# Altium footprint library 1.05-直插电感、共模电感.PcbLib: 35 footprints (part 1 of 3)
Each footprint in its own frame and in the unit in brackets; x right, y up, seen from the top. Pads: shape width x height; smd on the part's side, far side on the other; paste and mask are expansions set on the pad; w line width, h text height; cw(c..) or ccw(c..) is an arc to the next point about the centre after c.
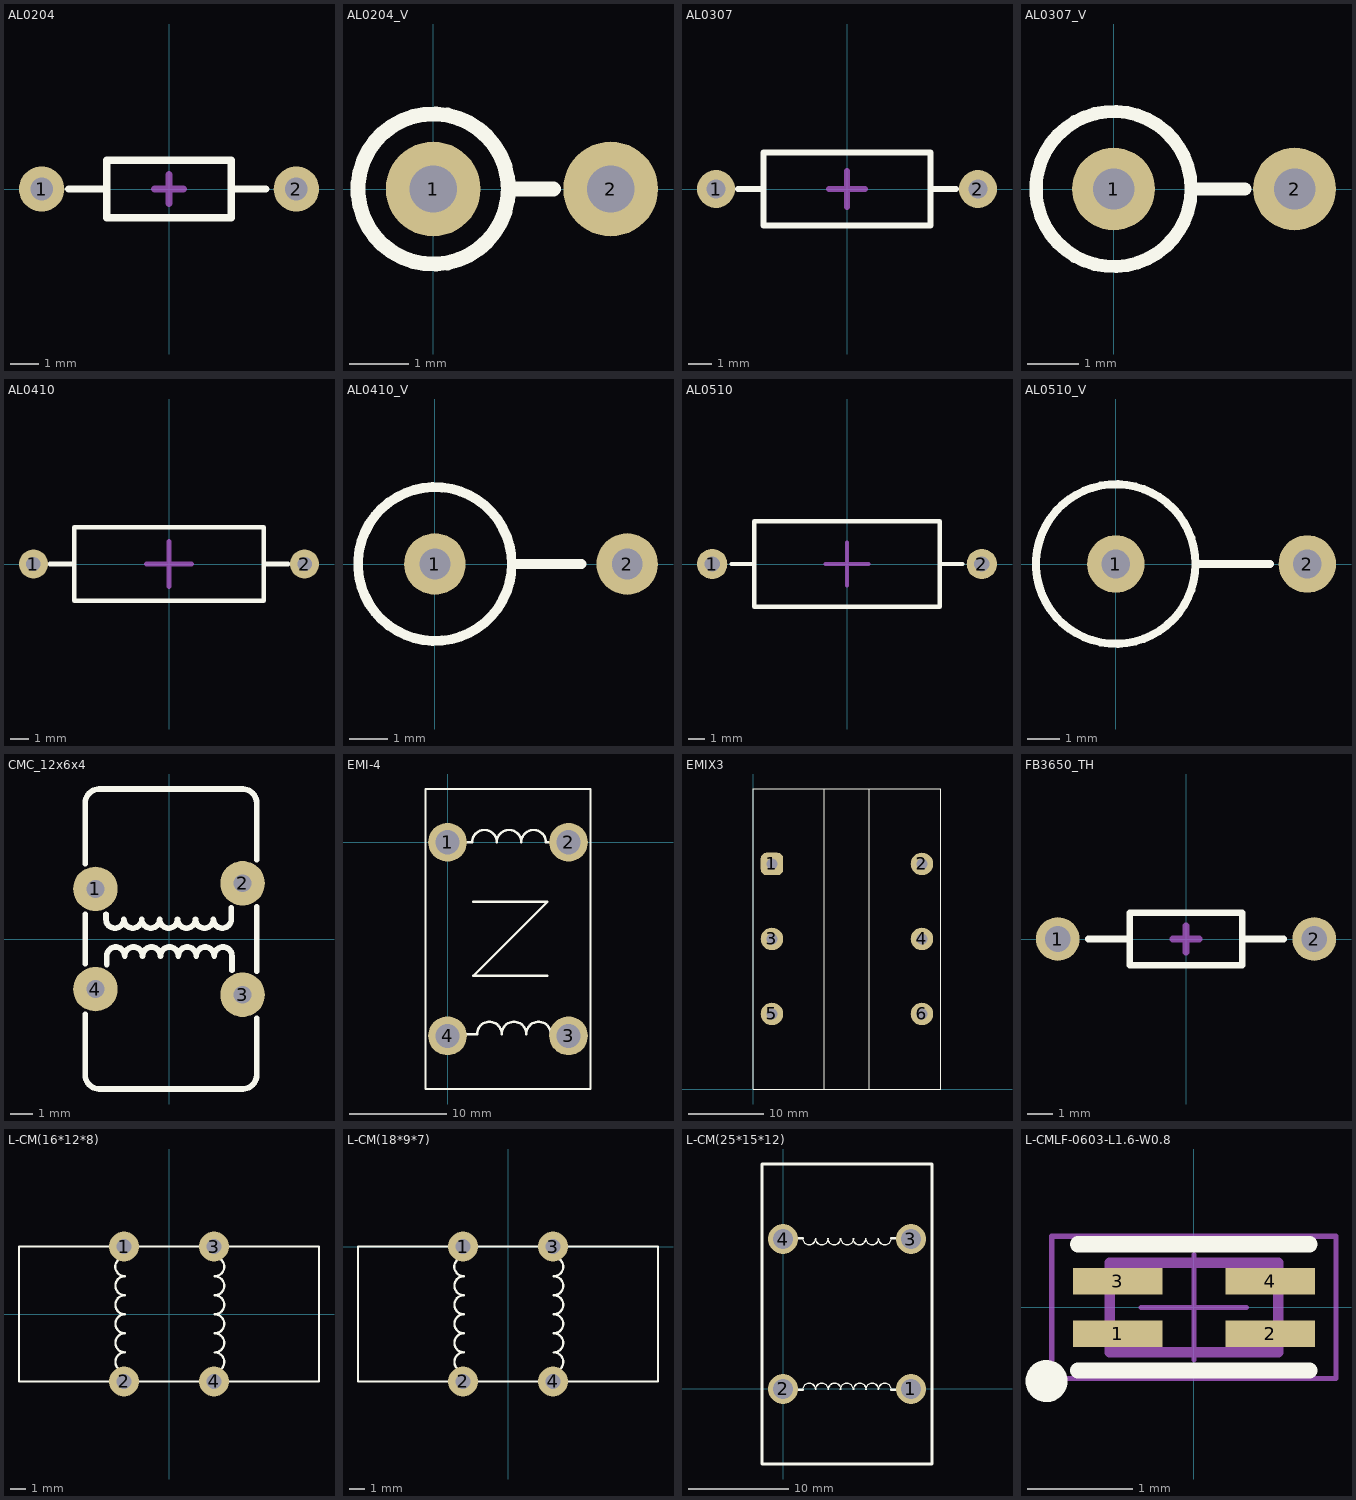
[diagram p0: the footprints below, top view; thin cyan lines are the x and y axes]

## AL0204 [mm] "9*2*4mm（脚距，直径，长度）"
pads (2):
  round 1.6 hole 0.8: 1(-4.5,0) 2(4.5,0)
Top Overlay:
  lines w0.254: -3.556,0 -2.2,0 ; -1.608,1.016 1.397,1.016 ; -1.524,-1.016 1.397,-1.016 ; -1.016,-1.016 -2.2,-1.016 -2.2,1.016 -1.016,1.016 ; -0.508,-1.016 0.508,-1.016 ; -0.508,1.016 0.508,1.016 ; 1.016,-1.016 2.2,-1.016 2.2,1.016 1.016,1.016 ; 2.2,0 3.429,0
Mechanical 15:
  lines w0.254: -0.508,0 0.508,0 ; 0,-0.508 0,0.508
3D body: height 2.07, standoff -3.5, extent -4.75,-1.018 4.75,1.018

## AL0204_V [mm] "3*2*4mm（脚距，直径，长度）"
pads (2):
  round 1.6 hole 0.8: 1(0,0) 2(3,0)
Top Overlay:
  circle w0.254: c0,0 r1.27
  lines w0.254: 1.27,0 2.032,0
3D body: height 5.48, standoff -3.5, extent -1.009,-1.009 3.25,1.009

## AL0307 [mm] "11*3*7mm（脚距，直径，长度）           联系卖家 免费查找封装"
pads (2):
  round 1.6 hole 0.8: 1(-5.5,0) 2(5.5,0)
Top Overlay:
  lines w0.254: -4.572,0 -3.5,0 ; -1.651,1.524 1.524,1.524 3.5,1.524 3.5,-1.524 1.524,-1.524 ; -1.524,1.524 -3.5,1.524 -3.5,-1.524 -1.524,-1.524 1.778,-1.524 ; -0.762,-1.524 0.762,-1.524 ; -0.762,1.524 0.762,1.524 ; 3.5,0 4.572,0
Mechanical 15:
  lines w0.254: -0.762,0 0.762,0 ; 0,-0.762 0,0.762
3D body: height 3.06, standoff -3.5, extent -5.775,-1.51 5.775,1.51

## AL0307_V [mm] "3.5*3*7mm（脚距，直径，长度）           联系卖家 免费查找封装"
pads (2):
  round 1.6 hole 0.8: 1(0,0) 2(3.5,0)
Top Overlay:
  circle w0.254: c0,0 r1.5
  lines w0.254: 1.5,0 2.54,0
3D body: height 8.8, standoff -3.5, extent -1.522,-1.522 3.775,1.522

## AL0410 [mm] "15*4*10.5mm（脚距，直径，长度）            联系卖家 免费查找封装"
pads (2):
  round 1.6 hole 0.8: 1(-7.5,0) 2(7.5,0)
Top Overlay:
  lines w0.254: -6.604,0 -5.25,0 ; -1.27,-2.032 1.27,-2.032 ; -1.27,2.032 1.27,2.032 ; 2.54,2.032 5.25,2.032 5.25,-2.032 2.54,-2.032 -2.54,-2.032 -5.25,-2.032 -5.25,2.032 -2.54,2.032 3.048,2.032 ; 5.25,0 6.604,0
Mechanical 15:
  lines w0.254: -1.27,0 1.27,0 ; 0,-1.27 0,1.27
3D body: height 4.06, standoff -3.5, extent -7.775,-2.009 7.775,2.009

## AL0410_V [mm] "5*4*10.5mm（脚距，直径，长度）           联系卖家 免费查找封装"
pads (2):
  round 1.6 hole 0.8: 1(0,0) 2(5,0)
Top Overlay:
  circle w0.254: c0,0 r2
  lines w0.254: 2,0 3.81,0
3D body: height 12.38, standoff -3.5, extent -2.01,-2.01 5.325,2.01

## AL0510 [mm] "16*5*10.5mm（脚距，直径，长度）           联系卖家 免费查找封装"
pads (2):
  round 1.8 hole 0.9: 1(-8,0) 2(8,0)
Top Overlay:
  lines w0.254: -6.858,0 -5.5,0 ; -2.794,2.54 2.921,2.54 ; -2.54,2.54 -5.5,2.54 -5.5,-2.54 -2.54,-2.54 3.048,-2.54 ; -1.27,-2.54 1.27,-2.54 ; -1.27,2.54 1.27,2.54 ; 2.54,-2.54 5.5,-2.54 5.5,2.54 2.54,2.54 ; 5.5,0 6.858,0
Mechanical 15:
  lines w0.254: -1.27,0 1.27,0 ; 0,-1.27 0,1.27
3D body: height 5.06, standoff -3.5, extent -8.35,-2.509 8.35,2.509

## AL0510_V [mm] "6*5*10.5mm（脚距，直径，长度）           联系卖家 免费查找封装"
pads (2):
  round 1.8 hole 0.9: 1(0,0) 2(6,0)
Top Overlay:
  circle w0.254: c0,0 r2.5
  lines w0.254: 2.5,0 4.826,0
3D body: height 13.36, standoff -3.5, extent -2.51,-2.51 6.35,2.51

## CMC_12x6x4 [mm] "直径：13.2mm，厚：7.2mm，脚距5*6.6mm"
pads (4):
  round 2 hole 0.8: 1(-3.3,2.25) 2(3.3,2.5) 3(3.3,-2.5) 4(-3.3,-2.25)
Top Overlay:
  lines w0.254: -3.759,-3.378 -3.759,-6.096 ccw(c-3.124,-6.096) -3.124,-6.731 3.175,-6.731 3.302,-6.731 ccw(c3.302,-6.096) 3.937,-6.096 3.937,-3.556 ; -3.759,-1.118 -3.759,0.584 -3.759,1.118 ; -3.759,3.378 -3.759,6.096 cw(c-3.124,6.096) -3.124,6.731 3.175,6.731 3.302,6.731 cw(c3.302,6.096) 3.937,6.096 3.937,3.556 ; -2.829,1.108 -2.829,0.889 ccw(c-2.427,0.889) -2.025,0.889 ccw(c-1.624,0.889) -1.222,0.889 ccw(c-0.82,0.889) -0.419,0.889 ccw(c-0.017,0.889) 0.384,0.889 ccw(c0.786,0.889) 1.188,0.889 ccw(c1.589,0.889) 1.991,0.889 ccw(c2.392,0.889) 2.794,0.889 2.794,1.397 ; -2.794,-1.143 -2.794,-0.762 cw(c-2.392,-0.762) -1.991,-0.762 cw(c-1.589,-0.762) -1.188,-0.762 cw(c-0.786,-0.762) -0.384,-0.762 cw(c0.017,-0.762) 0.419,-0.762 cw(c0.82,-0.762) 1.222,-0.762 cw(c1.624,-0.762) 2.025,-0.762 cw(c2.427,-0.762) 2.829,-0.762 2.829,-1.397 ; 3.937,-1.448 3.937,0.914 3.937,1.448
3D body: height 3.03, standoff -12.5, extent -3.61,-6.603 3.79,6.603

## EMI-4 [mm]
pads (4):
  round 4 hole 2.5: 1(0,0) 2(12.5,0) 3(12.5,-20) 4(0,-20)
Top Overlay:
  lines w0.203: -2.261,-25.486 14.757,-25.486 14.757,5.502 -2.261,5.502 -2.261,-25.486
  lines w0.254: 0.208,0 2.548,0 cw(c3.818,0) 5.088,0 cw(c6.358,0) 7.628,0 cw(c8.898,0) 10.168,0 12.5,0 ; 0.716,-19.812 3.056,-19.812 cw(c4.326,-19.812) 5.596,-19.812 cw(c6.866,-19.812) 8.136,-19.812 cw(c9.406,-19.812) 10.676,-19.812 13.008,-19.812 ; 2.68,-6.164 10.3,-6.164 ; 9.284,-6.164 10.3,-6.164 ; 9.792,-6.164 10.3,-6.164 ; 10.3,-13.784 2.68,-13.784 10.3,-6.164
3D body: height 36, standoff -5, extent -3.502,-24.492 15.998,4.508

## EMIX3 [mm]
pads (6):
  rrect50% 3x3 hole 1.5: 1(2.5,30)
  round 3 hole 1.5: 2(22.5,30) 3(2.5,20) 4(22.5,20) 5(2.5,10) 6(22.5,10)
Top Overlay:
  lines w0.15: 9.5,0 9.5,40 ; 15.5,0 15.5,40 ; 0,0 25,0 25,40 0,40 0,0
3D body: height 39.29, standoff -4, extent 0,0 25,40

## FB3650_TH [mm] "10*3.6*5.0mm（脚距，直径，长度）           联系卖家 免费查找封装"
pads (2):
  round 1.7 hole 1: 1(-5,0) 2(5,0)
Top Overlay:
  lines w0.254: -3.81,0 -2.2,0 ; -1.608,1.016 1.397,1.016 ; -1.524,-1.016 1.397,-1.016 ; -1.016,-1.016 -2.2,-1.016 -2.2,1.016 -1.016,1.016 ; -0.508,-1.016 0.508,-1.016 ; -0.508,1.016 0.508,1.016 ; 1.016,-1.016 2.2,-1.016 2.2,1.016 1.016,1.016 ; 2.2,0 3.81,0
Mechanical 15:
  lines w0.254: -0.508,0 0.508,0 ; 0,-0.508 0,0.508
3D body: height 3.7, standoff -3.6, extent -5.325,-1.8 5.325,1.8

## L-CM(16*12*8) [mm]
pads (4):
  round 2 hole 1: 1(-3,4.5) 2(-3,-4.5) 3(3,4.5) 4(3,-4.5)
Top Overlay:
  lines w0.15: -2.942,-0.02 cw(c-2.942,0.615) -2.942,1.25 ; -2.942,1.249 cw(c-2.942,1.884) -2.942,2.519 cw(c-2.943,3.153) -2.943,3.788 ; -2.941,-2.559 cw(c-2.941,-1.924) -2.941,-1.289 cw(c-2.941,-0.654) -2.941,-0.019 ; -2.94,-3.828 cw(c-2.94,-3.193) -2.94,-2.558 ; 3.046,2.516 ccw(c3.046,3.151) 3.046,3.786 ; 3.047,-0.023 ccw(c3.047,0.612) 3.047,1.247 ccw(c3.047,1.882) 3.047,2.517 ; 3.048,-2.561 ccw(c3.048,-1.926) 3.048,-1.291 ccw(c3.048,-0.657) 3.048,-0.022 ; 3.049,-3.83 ccw(c3.049,-3.195) 3.049,-2.56 ; -10,-4.5 -10,4.5 10,4.5 10,-4.5 -10,-4.5
3D body: height 0, standoff 0, extent 0.4,0.1 0.4,0.1
3D body: height 16.27, standoff -5.58, extent -8.775,-4.946 8.775,4.946

## L-CM(18*9*7) [mm]
pads (4):
  round 2 hole 1: 1(-3,0) 2(-3,-9) 3(3,0) 4(3,-9)
Top Overlay:
  lines w0.15: -2.942,-4.52 cw(c-2.942,-3.885) -2.942,-3.25 ; -2.942,-3.251 cw(c-2.942,-2.616) -2.942,-1.981 ; -2.943,-1.982 cw(c-2.943,-1.347) -2.943,-0.712 ; -2.941,-7.059 cw(c-2.941,-6.424) -2.941,-5.789 cw(c-2.941,-5.154) -2.941,-4.519 ; -2.94,-8.328 cw(c-2.94,-7.693) -2.94,-7.058 ; 3.046,-1.984 ccw(c3.046,-1.349) 3.046,-0.714 ; 3.047,-4.523 ccw(c3.047,-3.888) 3.047,-3.253 ccw(c3.047,-2.618) 3.047,-1.983 ; 3.048,-7.061 ccw(c3.048,-6.426) 3.048,-5.791 ; 3.048,-5.792 ccw(c3.048,-5.157) 3.048,-4.522 ; 3.049,-8.33 ccw(c3.049,-7.695) 3.049,-7.06 ; -10,-9 -10,0 10,0 10,-9 -10,-9
3D body: height 16.27, standoff -5.58, extent -8.775,-9.446 8.775,0.446

## L-CM(25*15*12) [mm] "联系卖家 免费查找封装"
pads (4):
  round 3 hole 2: 1(12.8,0) 2(0,0) 3(12.8,15) 4(0,15)
Top Overlay:
  lines w0.15: 1.981,-0.058 cw(c2.616,-0.058) 3.251,-0.058 ; 1.981,15.058 ccw(c2.616,15.058) 3.251,15.058 ; 3.25,-0.058 cw(c3.885,-0.058) 4.52,-0.058 ; 3.25,15.058 ccw(c3.885,15.058) 4.52,15.058 ; 4.472,15.06 ccw(c5.107,15.06) 5.742,15.06 ; 4.519,-0.059 cw(c5.154,-0.059) 5.789,-0.059 ; 5.741,-0.059 cw(c6.376,-0.059) 7.011,-0.059 ; 5.789,15.059 ccw(c6.424,15.059) 7.059,15.059 ; 7.011,15.059 ccw(c7.646,15.059) 8.281,15.059 ccw(c8.915,15.058) 9.55,15.058 ; 7.058,-0.06 cw(c7.693,-0.06) 8.328,-0.06 ; 8.28,-0.058 cw(c8.915,-0.058) 9.55,-0.058 ; 9.549,-0.058 cw(c10.184,-0.058) 10.819,-0.058 ; 9.549,15.058 ccw(c10.184,15.058) 10.819,15.058
  lines w0.254: 0.058,-0.058 1.981,-0.058 ; 0.058,15.058 1.981,15.058 ; 10.819,-0.058 12.742,-0.058 ; 10.819,15.058 12.742,15.058 ; -2.1,-7.5 -2.1,22.5 14.9,22.5 14.9,-7.5 -2.1,-7.5
3D body: height 27, standoff -5, extent -2.1,-7.002 14.9,22.002

## L-CMLF-0603-L1.6-W0.8 [mm] "SMT Common Mode Line Filter, 4-leads, body 1.6x0.85mm"
height 1.1
pads (4):
  rect 0.85x0.25 smd: 1(-0.725,-0.25) 2(0.725,-0.25) 3(-0.725,0.25) 4(0.725,0.25)
Top Overlay:
  circle w0.2: c-1.4,-0.7 r0.1
  lines w0.152: -1.1,-0.6 1.1,-0.6 ; -1.1,0.6 1.1,0.6
Mechanical 13:
  lines w0.1: -0.8,-0.425 -0.8,0.425 0.8,0.425 0.8,-0.425 -0.8,-0.425
Mechanical 15:
  lines w0.05: -0.5,0 0.5,0 ; 0,-0.5 0,0.5 ; -1.35,-0.675 -1.35,0.675 1.35,0.675 1.35,-0.675 -1.35,-0.675
3D body: height 1.11, standoff 0.01, extent -0.8,-0.425 0.8,0.425